# Altium footprint library ST封装.PcbLib: 1336 footprints (part 87 of 109) (continued)
## SQFP32X32-400(N) [mm] (continued)
Top Overlay:
  lines w0.2: -0.4,-30.3 -0.4,-31.95 1.25,-31.95 ; -0.4,0.6 -0.4,1.45 0.4,2.25 1.25,2.25 ; 32.15,-31.95 33.8,-31.95 33.8,-30.3 ; 32.15,2.25 33.8,2.25 33.8,0.6

## SQFP32X32-400(T) [mm]
pads (400):
  rect 0.2x1.6 smd: 1(0,0)
  oval 0.2x1.6 smd: 2(-0.3,0) 3(-0.6,0) 4(-0.9,0) 5(-1.2,0) 6(-1.5,0) 7(-1.8,0) 8(-2.1,0) 9(-2.4,0) 10(-2.7,0) 11(-3,0) 12(-3.3,0) 13(-3.6,0) 14(-3.9,0) 15(-4.2,0) 16(-4.5,0) 17(-4.8,0) 18(-5.1,0) 19(-5.4,0) 20(-5.7,0) 21(-6,0) 22(-6.3,0) 23(-6.6,0) 24(-6.9,0) 25(-7.2,0) 26(-7.5,0) 27(-7.8,0) 28(-8.1,0) 29(-8.4,0) 30(-8.7,0) 31(-9,0) 32(-9.3,0) 33(-9.6,0) 34(-9.9,0) 35(-10.2,0) 36(-10.5,0) 37(-10.8,0) 38(-11.1,0) 39(-11.4,0) 40(-11.7,0) 41(-12,0) 42(-12.3,0) 43(-12.6,0) 44(-12.9,0) 45(-13.2,0) 46(-13.5,0) 47(-13.8,0) 48(-14.1,0) 49(-14.4,0) 50(-14.7,0) 151(-14.7,-33.4) 152(-14.4,-33.4) 153(-14.1,-33.4) 154(-13.8,-33.4) 155(-13.5,-33.4) 156(-13.2,-33.4) 157(-12.9,-33.4) 158(-12.6,-33.4) 159(-12.3,-33.4) 160(-12,-33.4) 161(-11.7,-33.4) 162(-11.4,-33.4) 163(-11.1,-33.4) 164(-10.8,-33.4) 165(-10.5,-33.4) 166(-10.2,-33.4) 167(-9.9,-33.4) 168(-9.6,-33.4) 169(-9.3,-33.4) 170(-9,-33.4) 171(-8.7,-33.4) 172(-8.4,-33.4) 173(-8.1,-33.4) 174(-7.8,-33.4) 175(-7.5,-33.4) 176(-7.2,-33.4) 177(-6.9,-33.4) 178(-6.6,-33.4) 179(-6.3,-33.4) 180(-6,-33.4) 181(-5.7,-33.4) 182(-5.4,-33.4) 183(-5.1,-33.4) 184(-4.8,-33.4) 185(-4.5,-33.4) 186(-4.2,-33.4) 187(-3.9,-33.4) 188(-3.6,-33.4) 189(-3.3,-33.4) 190(-3,-33.4) 191(-2.7,-33.4) 192(-2.4,-33.4) 193(-2.1,-33.4) 194(-1.8,-33.4) 195(-1.5,-33.4) 196(-1.2,-33.4) 197(-0.9,-33.4) 198(-0.6,-33.4) 199(-0.3,-33.4) 200(0,-33.4) 201(0.3,-33.4) 202(0.6,-33.4) 203(0.9,-33.4) 204(1.2,-33.4) 205(1.5,-33.4) 206(1.8,-33.4) 207(2.1,-33.4) 208(2.4,-33.4) 209(2.7,-33.4) 210(3,-33.4) 211(3.3,-33.4) 212(3.6,-33.4) 213(3.9,-33.4) 214(4.2,-33.4) 215(4.5,-33.4) 216(4.8,-33.4) 217(5.1,-33.4) 218(5.4,-33.4) 219(5.7,-33.4) 220(6,-33.4) 221(6.3,-33.4) 222(6.6,-33.4) 223(6.9,-33.4) 224(7.2,-33.4) 225(7.5,-33.4) 226(7.8,-33.4) 227(8.1,-33.4) 228(8.4,-33.4) 229(8.7,-33.4) 230(9,-33.4) 231(9.3,-33.4) 232(9.6,-33.4) 233(9.9,-33.4) 234(10.2,-33.4) 235(10.5,-33.4) 236(10.8,-33.4) 237(11.1,-33.4) 238(11.4,-33.4) 239(11.7,-33.4) 240(12,-33.4) 241(12.3,-33.4) 242(12.6,-33.4) 243(12.9,-33.4) 244(13.2,-33.4) 245(13.5,-33.4) 246(13.8,-33.4) 247(14.1,-33.4) 248(14.4,-33.4) 249(14.7,-33.4) 250(15,-33.4) 351(15,0) 352(14.7,0) 353(14.4,0) 354(14.1,0) 355(13.8,0) 356(13.5,0) 357(13.2,0) 358(12.9,0) 359(12.6,0) 360(12.3,0) 361(12,0) 362(11.7,0) 363(11.4,0) 364(11.1,0) 365(10.8,0) 366(10.5,0) 367(10.2,0) 368(9.9,0) 369(9.6,0) 370(9.3,0) 371(9,0) 372(8.7,0) 373(8.4,0) 374(8.1,0) 375(7.8,0) 376(7.5,0) 377(7.2,0) 378(6.9,0) 379(6.6,0) 380(6.3,0) 381(6,0) 382(5.7,0) 383(5.4,0) 384(5.1,0) 385(4.8,0) 386(4.5,0) 387(4.2,0) 388(3.9,0) 389(3.6,0) 390(3.3,0) 391(3,0) 392(2.7,0) 393(2.4,0) 394(2.1,0) 395(1.8,0) 396(1.5,0) 397(1.2,0) 398(0.9,0) 399(0.6,0) 400(0.3,0)
  oval 1.6x0.2 smd: 51(-16.55,-1.85) 52(-16.55,-2.15) 53(-16.55,-2.45) 54(-16.55,-2.75) 55(-16.55,-3.05) 56(-16.55,-3.35) 57(-16.55,-3.65) 58(-16.55,-3.95) 59(-16.55,-4.25) 60(-16.55,-4.55) 61(-16.55,-4.85) 62(-16.55,-5.15) 63(-16.55,-5.45) 64(-16.55,-5.75) 65(-16.55,-6.05) 66(-16.55,-6.35) 67(-16.55,-6.65) 68(-16.55,-6.95) 69(-16.55,-7.25) 70(-16.55,-7.55) 71(-16.55,-7.85) 72(-16.55,-8.15) 73(-16.55,-8.45) 74(-16.55,-8.75) 75(-16.55,-9.05) 76(-16.55,-9.35) 77(-16.55,-9.65) 78(-16.55,-9.95) 79(-16.55,-10.25) 80(-16.55,-10.55) 81(-16.55,-10.85) 82(-16.55,-11.15) 83(-16.55,-11.45) 84(-16.55,-11.75) 85(-16.55,-12.05) 86(-16.55,-12.35) 87(-16.55,-12.65) 88(-16.55,-12.95) 89(-16.55,-13.25) 90(-16.55,-13.55) 91(-16.55,-13.85) 92(-16.55,-14.15) 93(-16.55,-14.45) 94(-16.55,-14.75) 95(-16.55,-15.05) 96(-16.55,-15.35) 97(-16.55,-15.65) 98(-16.55,-15.95) 99(-16.55,-16.25) 100(-16.55,-16.55) 101(-16.55,-16.85) 102(-16.55,-17.15) 103(-16.55,-17.45) 104(-16.55,-17.75) 105(-16.55,-18.05) 106(-16.55,-18.35) 107(-16.55,-18.65) 108(-16.55,-18.95) 109(-16.55,-19.25) 110(-16.55,-19.55) 111(-16.55,-19.85) 112(-16.55,-20.15) 113(-16.55,-20.45) 114(-16.55,-20.75) 115(-16.55,-21.05) 116(-16.55,-21.35) 117(-16.55,-21.65) 118(-16.55,-21.95) 119(-16.55,-22.25) 120(-16.55,-22.55) 121(-16.55,-22.85) 122(-16.55,-23.15) 123(-16.55,-23.45) 124(-16.55,-23.75) 125(-16.55,-24.05) 126(-16.55,-24.35) 127(-16.55,-24.65) 128(-16.55,-24.95) 129(-16.55,-25.25) 130(-16.55,-25.55) 131(-16.55,-25.85) 132(-16.55,-26.15) 133(-16.55,-26.45) 134(-16.55,-26.75) 135(-16.55,-27.05) 136(-16.55,-27.35) 137(-16.55,-27.65) 138(-16.55,-27.95) 139(-16.55,-28.25) 140(-16.55,-28.55) 141(-16.55,-28.85) 142(-16.55,-29.15) 143(-16.55,-29.45) 144(-16.55,-29.75) 145(-16.55,-30.05) 146(-16.55,-30.35) 147(-16.55,-30.65) 148(-16.55,-30.95) 149(-16.55,-31.25) 150(-16.55,-31.55) 251(16.85,-31.55) 252(16.85,-31.25) 253(16.85,-30.95) 254(16.85,-30.65) 255(16.85,-30.35) 256(16.85,-30.05) 257(16.85,-29.75) 258(16.85,-29.45) 259(16.85,-29.15) 260(16.85,-28.85) 261(16.85,-28.55) 262(16.85,-28.25) 263(16.85,-27.95) 264(16.85,-27.65) 265(16.85,-27.35) 266(16.85,-27.05) 267(16.85,-26.75) 268(16.85,-26.45) 269(16.85,-26.15) 270(16.85,-25.85) 271(16.85,-25.55) 272(16.85,-25.25) 273(16.85,-24.95) 274(16.85,-24.65) 275(16.85,-24.35) 276(16.85,-24.05) 277(16.85,-23.75) 278(16.85,-23.45) 279(16.85,-23.15) 280(16.85,-22.85) 281(16.85,-22.55) 282(16.85,-22.25) 283(16.85,-21.95) 284(16.85,-21.65) 285(16.85,-21.35) 286(16.85,-21.05) 287(16.85,-20.75) 288(16.85,-20.45) 289(16.85,-20.15) 290(16.85,-19.85) 291(16.85,-19.55) 292(16.85,-19.25) 293(16.85,-18.95) 294(16.85,-18.65) 295(16.85,-18.35) 296(16.85,-18.05) 297(16.85,-17.75) 298(16.85,-17.45) 299(16.85,-17.15) 300(16.85,-16.85) 301(16.85,-16.55) 302(16.85,-16.25) 303(16.85,-15.95) 304(16.85,-15.65) 305(16.85,-15.35) 306(16.85,-15.05) 307(16.85,-14.75) 308(16.85,-14.45) 309(16.85,-14.15) 310(16.85,-13.85) 311(16.85,-13.55) 312(16.85,-13.25) 313(16.85,-12.95) 314(16.85,-12.65) 315(16.85,-12.35) 316(16.85,-12.05) 317(16.85,-11.75) 318(16.85,-11.45) 319(16.85,-11.15) 320(16.85,-10.85) 321(16.85,-10.55) 322(16.85,-10.25) 323(16.85,-9.95) 324(16.85,-9.65) 325(16.85,-9.35) 326(16.85,-9.05) 327(16.85,-8.75) 328(16.85,-8.45) 329(16.85,-8.15) 330(16.85,-7.85) 331(16.85,-7.55) 332(16.85,-7.25) 333(16.85,-6.95) 334(16.85,-6.65) 335(16.85,-6.35) 336(16.85,-6.05) 337(16.85,-5.75) 338(16.85,-5.45) 339(16.85,-5.15) 340(16.85,-4.85) 341(16.85,-4.55) 342(16.85,-4.25) 343(16.85,-3.95) 344(16.85,-3.65) 345(16.85,-3.35) 346(16.85,-3.05) 347(16.85,-2.75) 348(16.85,-2.45) 349(16.85,-2.15) 350(16.85,-1.85)
Top Overlay:
  lines w0.2: -16.95,-32.15 -16.95,-33.8 -15.3,-33.8 ; -16.95,-1.25 -16.95,-0.4 -16.15,0.4 -15.3,0.4 ; 15.6,-33.8 17.25,-33.8 17.25,-32.15 ; 15.6,0.4 17.25,0.4 17.25,-1.25

## SQFP32X32-408(N) [mm]
pads (408):
  rect 1.6x0.2 smd: 1(0,0)
  oval 1.6x0.2 smd: 2(0,-0.3) 3(0,-0.6) 4(0,-0.9) 5(0,-1.2) 6(0,-1.5) 7(0,-1.8) 8(0,-2.1) 9(0,-2.4) 10(0,-2.7) 11(0,-3) 12(0,-3.3) 13(0,-3.6) 14(0,-3.9) 15(0,-4.2) 16(0,-4.5) 17(0,-4.8) 18(0,-5.1) 19(0,-5.4) 20(0,-5.7) 21(0,-6) 22(0,-6.3) 23(0,-6.6) 24(0,-6.9) 25(0,-7.2) 26(0,-7.5) 27(0,-7.8) 28(0,-8.1) 29(0,-8.4) 30(0,-8.7) 31(0,-9) 32(0,-9.3) 33(0,-9.6) 34(0,-9.9) 35(0,-10.2) 36(0,-10.5) 37(0,-10.8) 38(0,-11.1) 39(0,-11.4) 40(0,-11.7) 41(0,-12) 42(0,-12.3) 43(0,-12.6) 44(0,-12.9) 45(0,-13.2) 46(0,-13.5) 47(0,-13.8) 48(0,-14.1) 49(0,-14.4) 50(0,-14.7) 51(0,-15) 52(0,-15.3) 53(0,-15.6) 54(0,-15.9) 55(0,-16.2) 56(0,-16.5) 57(0,-16.8) 58(0,-17.1) 59(0,-17.4) 60(0,-17.7) 61(0,-18) 62(0,-18.3) 63(0,-18.6) 64(0,-18.9) 65(0,-19.2) 66(0,-19.5) 67(0,-19.8) 68(0,-20.1) 69(0,-20.4) 70(0,-20.7) 71(0,-21) 72(0,-21.3) 73(0,-21.6) 74(0,-21.9) 75(0,-22.2) 76(0,-22.5) 77(0,-22.8) 78(0,-23.1) 79(0,-23.4) 80(0,-23.7) 81(0,-24) 82(0,-24.3) 83(0,-24.6) 84(0,-24.9) 85(0,-25.2) 86(0,-25.5) 87(0,-25.8) 88(0,-26.1) 89(0,-26.4) 90(0,-26.7) 91(0,-27) 92(0,-27.3) 93(0,-27.6) 94(0,-27.9) 95(0,-28.2) 96(0,-28.5) 97(0,-28.8) 98(0,-29.1) 99(0,-29.4) 100(0,-29.7) 101(0,-30) 102(0,-30.3) 205(33.4,-30.3) 206(33.4,-30) 207(33.4,-29.7) 208(33.4,-29.4) 209(33.4,-29.1) 210(33.4,-28.8) 211(33.4,-28.5) 212(33.4,-28.2) 213(33.4,-27.9) 214(33.4,-27.6) 215(33.4,-27.3) 216(33.4,-27) 217(33.4,-26.7) 218(33.4,-26.4) 219(33.4,-26.1) 220(33.4,-25.8) 221(33.4,-25.5) 222(33.4,-25.2) 223(33.4,-24.9) 224(33.4,-24.6) 225(33.4,-24.3) 226(33.4,-24) 227(33.4,-23.7) 228(33.4,-23.4) 229(33.4,-23.1) 230(33.4,-22.8) 231(33.4,-22.5) 232(33.4,-22.2) 233(33.4,-21.9) 234(33.4,-21.6) 235(33.4,-21.3) 236(33.4,-21) 237(33.4,-20.7) 238(33.4,-20.4) 239(33.4,-20.1) 240(33.4,-19.8) 241(33.4,-19.5) 242(33.4,-19.2) 243(33.4,-18.9) 244(33.4,-18.6) 245(33.4,-18.3) 246(33.4,-18) 247(33.4,-17.7) 248(33.4,-17.4) 249(33.4,-17.1) 250(33.4,-16.8) 251(33.4,-16.5) 252(33.4,-16.2) 253(33.4,-15.9) 254(33.4,-15.6) 255(33.4,-15.3) 256(33.4,-15) 257(33.4,-14.7) 258(33.4,-14.4) 259(33.4,-14.1) 260(33.4,-13.8) 261(33.4,-13.5) 262(33.4,-13.2) 263(33.4,-12.9) 264(33.4,-12.6) 265(33.4,-12.3) 266(33.4,-12) 267(33.4,-11.7) 268(33.4,-11.4) 269(33.4,-11.1) 270(33.4,-10.8) 271(33.4,-10.5) 272(33.4,-10.2) 273(33.4,-9.9) 274(33.4,-9.6) 275(33.4,-9.3) 276(33.4,-9) 277(33.4,-8.7) 278(33.4,-8.4) 279(33.4,-8.1) 280(33.4,-7.8) 281(33.4,-7.5) 282(33.4,-7.2) 283(33.4,-6.9) 284(33.4,-6.6) 285(33.4,-6.3) 286(33.4,-6) 287(33.4,-5.7) 288(33.4,-5.4) 289(33.4,-5.1) 290(33.4,-4.8) 291(33.4,-4.5) 292(33.4,-4.2) 293(33.4,-3.9) 294(33.4,-3.6) 295(33.4,-3.3) 296(33.4,-3) 297(33.4,-2.7) 298(33.4,-2.4) 299(33.4,-2.1) 300(33.4,-1.8) 301(33.4,-1.5) 302(33.4,-1.2) 303(33.4,-0.9) 304(33.4,-0.6) 305(33.4,-0.3) 306(33.4,0)
  oval 0.2x1.6 smd: 103(1.55,-31.85) 104(1.85,-31.85) 105(2.15,-31.85) 106(2.45,-31.85) 107(2.75,-31.85) 108(3.05,-31.85) 109(3.35,-31.85) 110(3.65,-31.85) 111(3.95,-31.85) 112(4.25,-31.85) 113(4.55,-31.85) 114(4.85,-31.85) 115(5.15,-31.85) 116(5.45,-31.85) 117(5.75,-31.85) 118(6.05,-31.85) 119(6.35,-31.85) 120(6.65,-31.85) 121(6.95,-31.85) 122(7.25,-31.85) 123(7.55,-31.85) 124(7.85,-31.85) 125(8.15,-31.85) 126(8.45,-31.85) 127(8.75,-31.85) 128(9.05,-31.85) 129(9.35,-31.85) 130(9.65,-31.85) 131(9.95,-31.85) 132(10.25,-31.85) 133(10.55,-31.85) 134(10.85,-31.85) 135(11.15,-31.85) 136(11.45,-31.85) 137(11.75,-31.85) 138(12.05,-31.85) 139(12.35,-31.85) 140(12.65,-31.85) 141(12.95,-31.85) 142(13.25,-31.85) 143(13.55,-31.85) 144(13.85,-31.85) 145(14.15,-31.85) 146(14.45,-31.85) 147(14.75,-31.85) 148(15.05,-31.85) 149(15.35,-31.85) 150(15.65,-31.85) 151(15.95,-31.85) 152(16.25,-31.85) 153(16.55,-31.85) 154(16.85,-31.85) 155(17.15,-31.85) 156(17.45,-31.85) 157(17.75,-31.85) 158(18.05,-31.85) 159(18.35,-31.85) 160(18.65,-31.85) 161(18.95,-31.85) 162(19.25,-31.85) 163(19.55,-31.85) 164(19.85,-31.85) 165(20.15,-31.85) 166(20.45,-31.85) 167(20.75,-31.85) 168(21.05,-31.85) 169(21.35,-31.85) 170(21.65,-31.85) 171(21.95,-31.85) 172(22.25,-31.85) 173(22.55,-31.85) 174(22.85,-31.85) 175(23.15,-31.85) 176(23.45,-31.85) 177(23.75,-31.85) 178(24.05,-31.85) 179(24.35,-31.85) 180(24.65,-31.85) 181(24.95,-31.85) 182(25.25,-31.85) 183(25.55,-31.85) 184(25.85,-31.85) 185(26.15,-31.85) 186(26.45,-31.85) 187(26.75,-31.85) 188(27.05,-31.85) 189(27.35,-31.85) 190(27.65,-31.85) 191(27.95,-31.85) 192(28.25,-31.85) 193(28.55,-31.85) 194(28.85,-31.85) 195(29.15,-31.85) 196(29.45,-31.85) 197(29.75,-31.85) 198(30.05,-31.85) 199(30.35,-31.85) 200(30.65,-31.85) 201(30.95,-31.85) 202(31.25,-31.85) 203(31.55,-31.85) 204(31.85,-31.85) 307(31.85,1.55) 308(31.55,1.55) 309(31.25,1.55) 310(30.95,1.55) 311(30.65,1.55) 312(30.35,1.55) 313(30.05,1.55) 314(29.75,1.55) 315(29.45,1.55) 316(29.15,1.55) 317(28.85,1.55) 318(28.55,1.55) 319(28.25,1.55) 320(27.95,1.55) 321(27.65,1.55) 322(27.35,1.55) 323(27.05,1.55) 324(26.75,1.55) 325(26.45,1.55) 326(26.15,1.55) 327(25.85,1.55) 328(25.55,1.55) 329(25.25,1.55) 330(24.95,1.55) 331(24.65,1.55) 332(24.35,1.55) 333(24.05,1.55) 334(23.75,1.55) 335(23.45,1.55) 336(23.15,1.55) 337(22.85,1.55) 338(22.55,1.55) 339(22.25,1.55) 340(21.95,1.55) 341(21.65,1.55) 342(21.35,1.55) 343(21.05,1.55) 344(20.75,1.55) 345(20.45,1.55) 346(20.15,1.55) 347(19.85,1.55) 348(19.55,1.55) 349(19.25,1.55) 350(18.95,1.55) 351(18.65,1.55) 352(18.35,1.55) 353(18.05,1.55) 354(17.75,1.55) 355(17.45,1.55) 356(17.15,1.55) 357(16.85,1.55) 358(16.55,1.55) 359(16.25,1.55) 360(15.95,1.55) 361(15.65,1.55) 362(15.35,1.55) 363(15.05,1.55) 364(14.75,1.55) 365(14.45,1.55) 366(14.15,1.55) 367(13.85,1.55) 368(13.55,1.55) 369(13.25,1.55) 370(12.95,1.55) 371(12.65,1.55) 372(12.35,1.55) 373(12.05,1.55) 374(11.75,1.55) 375(11.45,1.55) 376(11.15,1.55) 377(10.85,1.55) 378(10.55,1.55) 379(10.25,1.55) 380(9.95,1.55) 381(9.65,1.55) 382(9.35,1.55) 383(9.05,1.55) 384(8.75,1.55) 385(8.45,1.55) 386(8.15,1.55) 387(7.85,1.55) 388(7.55,1.55) 389(7.25,1.55) 390(6.95,1.55) 391(6.65,1.55) 392(6.35,1.55) 393(6.05,1.55) 394(5.75,1.55) 395(5.45,1.55) 396(5.15,1.55) 397(4.85,1.55) 398(4.55,1.55) 399(4.25,1.55) 400(3.95,1.55) 401(3.65,1.55) 402(3.35,1.55) 403(3.05,1.55) 404(2.75,1.55) 405(2.45,1.55) 406(2.15,1.55) 407(1.85,1.55) 408(1.55,1.55)
Top Overlay:
  lines w0.2: -0.4,-30.9 -0.4,-32.25 0.95,-32.25 ; -0.4,0.6 -0.4,1.15 0.4,1.95 0.95,1.95 ; 32.45,-32.25 33.8,-32.25 33.8,-30.9 ; 32.45,1.95 33.8,1.95 33.8,0.6

## SQFP32X32-408(T) [mm]
pads (408):
  rect 0.2x1.6 smd: 1(0,0)
  oval 0.2x1.6 smd: 2(-0.3,0) 3(-0.6,0) 4(-0.9,0) 5(-1.2,0) 6(-1.5,0) 7(-1.8,0) 8(-2.1,0) 9(-2.4,0) 10(-2.7,0) 11(-3,0) 12(-3.3,0) 13(-3.6,0) 14(-3.9,0) 15(-4.2,0) 16(-4.5,0) 17(-4.8,0) 18(-5.1,0) 19(-5.4,0) 20(-5.7,0) 21(-6,0) 22(-6.3,0) 23(-6.6,0) 24(-6.9,0) 25(-7.2,0) 26(-7.5,0) 27(-7.8,0) 28(-8.1,0) 29(-8.4,0) 30(-8.7,0) 31(-9,0) 32(-9.3,0) 33(-9.6,0) 34(-9.9,0) 35(-10.2,0) 36(-10.5,0) 37(-10.8,0) 38(-11.1,0) 39(-11.4,0) 40(-11.7,0) 41(-12,0) 42(-12.3,0) 43(-12.6,0) 44(-12.9,0) 45(-13.2,0) 46(-13.5,0) 47(-13.8,0) 48(-14.1,0) 49(-14.4,0) 50(-14.7,0) 51(-15,0) 154(-15,-33.4) 155(-14.7,-33.4) 156(-14.4,-33.4) 157(-14.1,-33.4) 158(-13.8,-33.4) 159(-13.5,-33.4) 160(-13.2,-33.4) 161(-12.9,-33.4) 162(-12.6,-33.4) 163(-12.3,-33.4) 164(-12,-33.4) 165(-11.7,-33.4) 166(-11.4,-33.4) 167(-11.1,-33.4) 168(-10.8,-33.4) 169(-10.5,-33.4) 170(-10.2,-33.4) 171(-9.9,-33.4) 172(-9.6,-33.4) 173(-9.3,-33.4) 174(-9,-33.4) 175(-8.7,-33.4) 176(-8.4,-33.4) 177(-8.1,-33.4) 178(-7.8,-33.4) 179(-7.5,-33.4) 180(-7.2,-33.4) 181(-6.9,-33.4) 182(-6.6,-33.4) 183(-6.3,-33.4) 184(-6,-33.4) 185(-5.7,-33.4) 186(-5.4,-33.4) 187(-5.1,-33.4) 188(-4.8,-33.4) 189(-4.5,-33.4) 190(-4.2,-33.4) 191(-3.9,-33.4) 192(-3.6,-33.4) 193(-3.3,-33.4) 194(-3,-33.4) 195(-2.7,-33.4) 196(-2.4,-33.4) 197(-2.1,-33.4) 198(-1.8,-33.4) 199(-1.5,-33.4) 200(-1.2,-33.4) 201(-0.9,-33.4) 202(-0.6,-33.4) 203(-0.3,-33.4) 204(0,-33.4) 205(0.3,-33.4) 206(0.6,-33.4) 207(0.9,-33.4) 208(1.2,-33.4) 209(1.5,-33.4) 210(1.8,-33.4) 211(2.1,-33.4) 212(2.4,-33.4) 213(2.7,-33.4) 214(3,-33.4) 215(3.3,-33.4) 216(3.6,-33.4) 217(3.9,-33.4) 218(4.2,-33.4) 219(4.5,-33.4) 220(4.8,-33.4) 221(5.1,-33.4) 222(5.4,-33.4) 223(5.7,-33.4) 224(6,-33.4) 225(6.3,-33.4) 226(6.6,-33.4) 227(6.9,-33.4) 228(7.2,-33.4) 229(7.5,-33.4) 230(7.8,-33.4) 231(8.1,-33.4) 232(8.4,-33.4) 233(8.7,-33.4) 234(9,-33.4) 235(9.3,-33.4) 236(9.6,-33.4) 237(9.9,-33.4) 238(10.2,-33.4) 239(10.5,-33.4) 240(10.8,-33.4) 241(11.1,-33.4) 242(11.4,-33.4) 243(11.7,-33.4) 244(12,-33.4) 245(12.3,-33.4) 246(12.6,-33.4) 247(12.9,-33.4) 248(13.2,-33.4) 249(13.5,-33.4) 250(13.8,-33.4) 251(14.1,-33.4) 252(14.4,-33.4) 253(14.7,-33.4) 254(15,-33.4) 255(15.3,-33.4) 358(15.3,0) 359(15,0) 360(14.7,0) 361(14.4,0) 362(14.1,0) 363(13.8,0) 364(13.5,0) 365(13.2,0) 366(12.9,0) 367(12.6,0) 368(12.3,0) 369(12,0) 370(11.7,0) 371(11.4,0) 372(11.1,0) 373(10.8,0) 374(10.5,0) 375(10.2,0) 376(9.9,0) 377(9.6,0) 378(9.3,0) 379(9,0) 380(8.7,0) 381(8.4,0) 382(8.1,0) 383(7.8,0) 384(7.5,0) 385(7.2,0) 386(6.9,0) 387(6.6,0) 388(6.3,0) 389(6,0) 390(5.7,0) 391(5.4,0) 392(5.1,0) 393(4.8,0) 394(4.5,0) 395(4.2,0) 396(3.9,0) 397(3.6,0) 398(3.3,0) 399(3,0) 400(2.7,0) 401(2.4,0) 402(2.1,0) 403(1.8,0) 404(1.5,0) 405(1.2,0) 406(0.9,0) 407(0.6,0) 408(0.3,0)
  oval 1.6x0.2 smd: 52(-16.55,-1.55) 53(-16.55,-1.85) 54(-16.55,-2.15) 55(-16.55,-2.45) 56(-16.55,-2.75) 57(-16.55,-3.05) 58(-16.55,-3.35) 59(-16.55,-3.65) 60(-16.55,-3.95) 61(-16.55,-4.25) 62(-16.55,-4.55) 63(-16.55,-4.85) 64(-16.55,-5.15) 65(-16.55,-5.45) 66(-16.55,-5.75) 67(-16.55,-6.05) 68(-16.55,-6.35) 69(-16.55,-6.65) 70(-16.55,-6.95) 71(-16.55,-7.25) 72(-16.55,-7.55) 73(-16.55,-7.85) 74(-16.55,-8.15) 75(-16.55,-8.45) 76(-16.55,-8.75) 77(-16.55,-9.05) 78(-16.55,-9.35) 79(-16.55,-9.65) 80(-16.55,-9.95) 81(-16.55,-10.25) 82(-16.55,-10.55) 83(-16.55,-10.85) 84(-16.55,-11.15) 85(-16.55,-11.45) 86(-16.55,-11.75) 87(-16.55,-12.05) 88(-16.55,-12.35) 89(-16.55,-12.65) 90(-16.55,-12.95) 91(-16.55,-13.25) 92(-16.55,-13.55) 93(-16.55,-13.85) 94(-16.55,-14.15) 95(-16.55,-14.45) 96(-16.55,-14.75) 97(-16.55,-15.05) 98(-16.55,-15.35) 99(-16.55,-15.65) 100(-16.55,-15.95) 101(-16.55,-16.25) 102(-16.55,-16.55) 103(-16.55,-16.85) 104(-16.55,-17.15) 105(-16.55,-17.45) 106(-16.55,-17.75) 107(-16.55,-18.05) 108(-16.55,-18.35) 109(-16.55,-18.65) 110(-16.55,-18.95) 111(-16.55,-19.25) 112(-16.55,-19.55) 113(-16.55,-19.85) 114(-16.55,-20.15) 115(-16.55,-20.45) 116(-16.55,-20.75) 117(-16.55,-21.05) 118(-16.55,-21.35) 119(-16.55,-21.65) 120(-16.55,-21.95) 121(-16.55,-22.25) 122(-16.55,-22.55) 123(-16.55,-22.85) 124(-16.55,-23.15) 125(-16.55,-23.45) 126(-16.55,-23.75) 127(-16.55,-24.05) 128(-16.55,-24.35) 129(-16.55,-24.65) 130(-16.55,-24.95) 131(-16.55,-25.25) 132(-16.55,-25.55) 133(-16.55,-25.85) 134(-16.55,-26.15) 135(-16.55,-26.45) 136(-16.55,-26.75) 137(-16.55,-27.05) 138(-16.55,-27.35) 139(-16.55,-27.65) 140(-16.55,-27.95) 141(-16.55,-28.25) 142(-16.55,-28.55) 143(-16.55,-28.85) 144(-16.55,-29.15) 145(-16.55,-29.45) 146(-16.55,-29.75) 147(-16.55,-30.05) 148(-16.55,-30.35) 149(-16.55,-30.65) 150(-16.55,-30.95) 151(-16.55,-31.25) 152(-16.55,-31.55) 153(-16.55,-31.85) 256(16.85,-31.85) 257(16.85,-31.55) 258(16.85,-31.25) 259(16.85,-30.95) 260(16.85,-30.65) 261(16.85,-30.35) 262(16.85,-30.05) 263(16.85,-29.75) 264(16.85,-29.45) 265(16.85,-29.15) 266(16.85,-28.85) 267(16.85,-28.55) 268(16.85,-28.25) 269(16.85,-27.95) 270(16.85,-27.65) 271(16.85,-27.35) 272(16.85,-27.05) 273(16.85,-26.75) 274(16.85,-26.45) 275(16.85,-26.15) 276(16.85,-25.85) 277(16.85,-25.55) 278(16.85,-25.25) 279(16.85,-24.95) 280(16.85,-24.65) 281(16.85,-24.35) 282(16.85,-24.05) 283(16.85,-23.75) 284(16.85,-23.45) 285(16.85,-23.15) 286(16.85,-22.85) 287(16.85,-22.55) 288(16.85,-22.25) 289(16.85,-21.95) 290(16.85,-21.65) 291(16.85,-21.35) 292(16.85,-21.05) 293(16.85,-20.75) 294(16.85,-20.45) 295(16.85,-20.15) 296(16.85,-19.85) 297(16.85,-19.55) 298(16.85,-19.25) 299(16.85,-18.95) 300(16.85,-18.65) 301(16.85,-18.35) 302(16.85,-18.05) 303(16.85,-17.75) 304(16.85,-17.45) 305(16.85,-17.15) 306(16.85,-16.85) 307(16.85,-16.55) 308(16.85,-16.25) 309(16.85,-15.95) 310(16.85,-15.65) 311(16.85,-15.35) 312(16.85,-15.05) 313(16.85,-14.75) 314(16.85,-14.45) 315(16.85,-14.15) 316(16.85,-13.85) 317(16.85,-13.55) 318(16.85,-13.25) 319(16.85,-12.95) 320(16.85,-12.65) 321(16.85,-12.35) 322(16.85,-12.05) 323(16.85,-11.75) 324(16.85,-11.45) 325(16.85,-11.15) 326(16.85,-10.85) 327(16.85,-10.55) 328(16.85,-10.25) 329(16.85,-9.95) 330(16.85,-9.65) 331(16.85,-9.35) 332(16.85,-9.05) 333(16.85,-8.75) 334(16.85,-8.45) 335(16.85,-8.15) 336(16.85,-7.85) 337(16.85,-7.55) 338(16.85,-7.25) 339(16.85,-6.95) 340(16.85,-6.65) 341(16.85,-6.35) 342(16.85,-6.05) 343(16.85,-5.75) 344(16.85,-5.45) 345(16.85,-5.15) 346(16.85,-4.85) 347(16.85,-4.55) 348(16.85,-4.25) 349(16.85,-3.95) 350(16.85,-3.65) 351(16.85,-3.35) 352(16.85,-3.05) 353(16.85,-2.75) 354(16.85,-2.45) 355(16.85,-2.15) 356(16.85,-1.85) 357(16.85,-1.55)
Top Overlay:
  lines w0.2: -16.95,-32.45 -16.95,-33.8 -15.6,-33.8 ; -16.95,-0.95 -16.95,-0.4 -16.15,0.4 -15.6,0.4 ; 15.9,-33.8 17.25,-33.8 17.25,-32.45 ; 15.9,0.4 17.25,0.4 17.25,-0.95

## SQFP36X36-272(N) [mm]
pads (272):
  rect 1.6x0.4 smd: 1(0,0)
  oval 1.6x0.4 smd: 2(0,-0.5) 3(0,-1) 4(0,-1.5) 5(0,-2) 6(0,-2.5) 7(0,-3) 8(0,-3.5) 9(0,-4) 10(0,-4.5) 11(0,-5) 12(0,-5.5) 13(0,-6) 14(0,-6.5) 15(0,-7) 16(0,-7.5) 17(0,-8) 18(0,-8.5) 19(0,-9) 20(0,-9.5) 21(0,-10) 22(0,-10.5) 23(0,-11) 24(0,-11.5) 25(0,-12) 26(0,-12.5) 27(0,-13) 28(0,-13.5) 29(0,-14) 30(0,-14.5) 31(0,-15) 32(0,-15.5) 33(0,-16) 34(0,-16.5) 35(0,-17) 36(0,-17.5) 37(0,-18) 38(0,-18.5) 39(0,-19) 40(0,-19.5) 41(0,-20) 42(0,-20.5) 43(0,-21) 44(0,-21.5) 45(0,-22) 46(0,-22.5) 47(0,-23) 48(0,-23.5) 49(0,-24) 50(0,-24.5) 51(0,-25) 52(0,-25.5) 53(0,-26) 54(0,-26.5) 55(0,-27) 56(0,-27.5) 57(0,-28) 58(0,-28.5) 59(0,-29) 60(0,-29.5) 61(0,-30) 62(0,-30.5) 63(0,-31) 64(0,-31.5) 65(0,-32) 66(0,-32.5) 67(0,-33) 68(0,-33.5) 137(37.4,-33.5) 138(37.4,-33) 139(37.4,-32.5) 140(37.4,-32) 141(37.4,-31.5) 142(37.4,-31) 143(37.4,-30.5) 144(37.4,-30) 145(37.4,-29.5) 146(37.4,-29) 147(37.4,-28.5) 148(37.4,-28) 149(37.4,-27.5) 150(37.4,-27) 151(37.4,-26.5) 152(37.4,-26) 153(37.4,-25.5) 154(37.4,-25) 155(37.4,-24.5) 156(37.4,-24) 157(37.4,-23.5) 158(37.4,-23) 159(37.4,-22.5) 160(37.4,-22) 161(37.4,-21.5) 162(37.4,-21) 163(37.4,-20.5) 164(37.4,-20) 165(37.4,-19.5) 166(37.4,-19) 167(37.4,-18.5) 168(37.4,-18) 169(37.4,-17.5) 170(37.4,-17) 171(37.4,-16.5) 172(37.4,-16) 173(37.4,-15.5) 174(37.4,-15) 175(37.4,-14.5) 176(37.4,-14) 177(37.4,-13.5) 178(37.4,-13) 179(37.4,-12.5) 180(37.4,-12) 181(37.4,-11.5) 182(37.4,-11) 183(37.4,-10.5) 184(37.4,-10) 185(37.4,-9.5) 186(37.4,-9) 187(37.4,-8.5) 188(37.4,-8) 189(37.4,-7.5) 190(37.4,-7) 191(37.4,-6.5) 192(37.4,-6) 193(37.4,-5.5) 194(37.4,-5) 195(37.4,-4.5) 196(37.4,-4) 197(37.4,-3.5) 198(37.4,-3) 199(37.4,-2.5) 200(37.4,-2) 201(37.4,-1.5) 202(37.4,-1) 203(37.4,-0.5) 204(37.4,0)
  oval 0.4x1.6 smd: 69(1.95,-35.45) 70(2.45,-35.45) 71(2.95,-35.45) 72(3.45,-35.45) 73(3.95,-35.45) 74(4.45,-35.45) 75(4.95,-35.45) 76(5.45,-35.45) 77(5.95,-35.45) 78(6.45,-35.45) 79(6.95,-35.45) 80(7.45,-35.45) 81(7.95,-35.45) 82(8.45,-35.45) 83(8.95,-35.45) 84(9.45,-35.45) 85(9.95,-35.45) 86(10.45,-35.45) 87(10.95,-35.45) 88(11.45,-35.45) 89(11.95,-35.45) 90(12.45,-35.45) 91(12.95,-35.45) 92(13.45,-35.45) 93(13.95,-35.45) 94(14.45,-35.45) 95(14.95,-35.45) 96(15.45,-35.45) 97(15.95,-35.45) 98(16.45,-35.45) 99(16.95,-35.45) 100(17.45,-35.45) 101(17.95,-35.45) 102(18.45,-35.45) 103(18.95,-35.45) 104(19.45,-35.45) 105(19.95,-35.45) 106(20.45,-35.45) 107(20.95,-35.45) 108(21.45,-35.45) 109(21.95,-35.45) 110(22.45,-35.45) 111(22.95,-35.45) 112(23.45,-35.45) 113(23.95,-35.45) 114(24.45,-35.45) 115(24.95,-35.45) 116(25.45,-35.45) 117(25.95,-35.45) 118(26.45,-35.45) 119(26.95,-35.45) 120(27.45,-35.45) 121(27.95,-35.45) 122(28.45,-35.45) 123(28.95,-35.45) 124(29.45,-35.45) 125(29.95,-35.45) 126(30.45,-35.45) 127(30.95,-35.45) 128(31.45,-35.45) 129(31.95,-35.45) 130(32.45,-35.45) 131(32.95,-35.45) 132(33.45,-35.45) 133(33.95,-35.45) 134(34.45,-35.45) 135(34.95,-35.45) 136(35.45,-35.45) 205(35.45,1.95) 206(34.95,1.95) 207(34.45,1.95) 208(33.95,1.95) 209(33.45,1.95) 210(32.95,1.95) 211(32.45,1.95) 212(31.95,1.95) 213(31.45,1.95) 214(30.95,1.95) 215(30.45,1.95) 216(29.95,1.95) 217(29.45,1.95) 218(28.95,1.95) 219(28.45,1.95) 220(27.95,1.95) 221(27.45,1.95) 222(26.95,1.95) 223(26.45,1.95) 224(25.95,1.95) 225(25.45,1.95) 226(24.95,1.95) 227(24.45,1.95) 228(23.95,1.95) 229(23.45,1.95) 230(22.95,1.95) 231(22.45,1.95) 232(21.95,1.95) 233(21.45,1.95) 234(20.95,1.95) 235(20.45,1.95) 236(19.95,1.95) 237(19.45,1.95) 238(18.95,1.95) 239(18.45,1.95) 240(17.95,1.95) 241(17.45,1.95) 242(16.95,1.95) 243(16.45,1.95) 244(15.95,1.95) 245(15.45,1.95) 246(14.95,1.95) 247(14.45,1.95) 248(13.95,1.95) 249(13.45,1.95) 250(12.95,1.95) 251(12.45,1.95) 252(11.95,1.95) 253(11.45,1.95) 254(10.95,1.95) 255(10.45,1.95) 256(9.95,1.95) 257(9.45,1.95) 258(8.95,1.95) 259(8.45,1.95) 260(7.95,1.95) 261(7.45,1.95) 262(6.95,1.95) 263(6.45,1.95) 264(5.95,1.95) 265(5.45,1.95) 266(4.95,1.95) 267(4.45,1.95) 268(3.95,1.95) 269(3.45,1.95) 270(2.95,1.95) 271(2.45,1.95) 272(1.95,1.95)
Top Overlay:
  lines w0.2: -0.4,-34.2 -0.4,-35.85 1.25,-35.85 ; -0.4,0.7 -0.4,1.55 0.4,2.35 1.25,2.35 ; 36.15,-35.85 37.8,-35.85 37.8,-34.2 ; 36.15,2.35 37.8,2.35 37.8,0.7